# Altium footprint library Supernova.PcbLib: 77 footprints (part 3 of 6)
Each footprint in its own frame and in the unit in brackets; x right, y up, seen from the top. Pads: shape width x height; smd on the part's side, far side on the other; paste and mask are expansions set on the pad; w line width, h text height; cw(c..) or ccw(c..) is an arc to the next point about the centre after c.
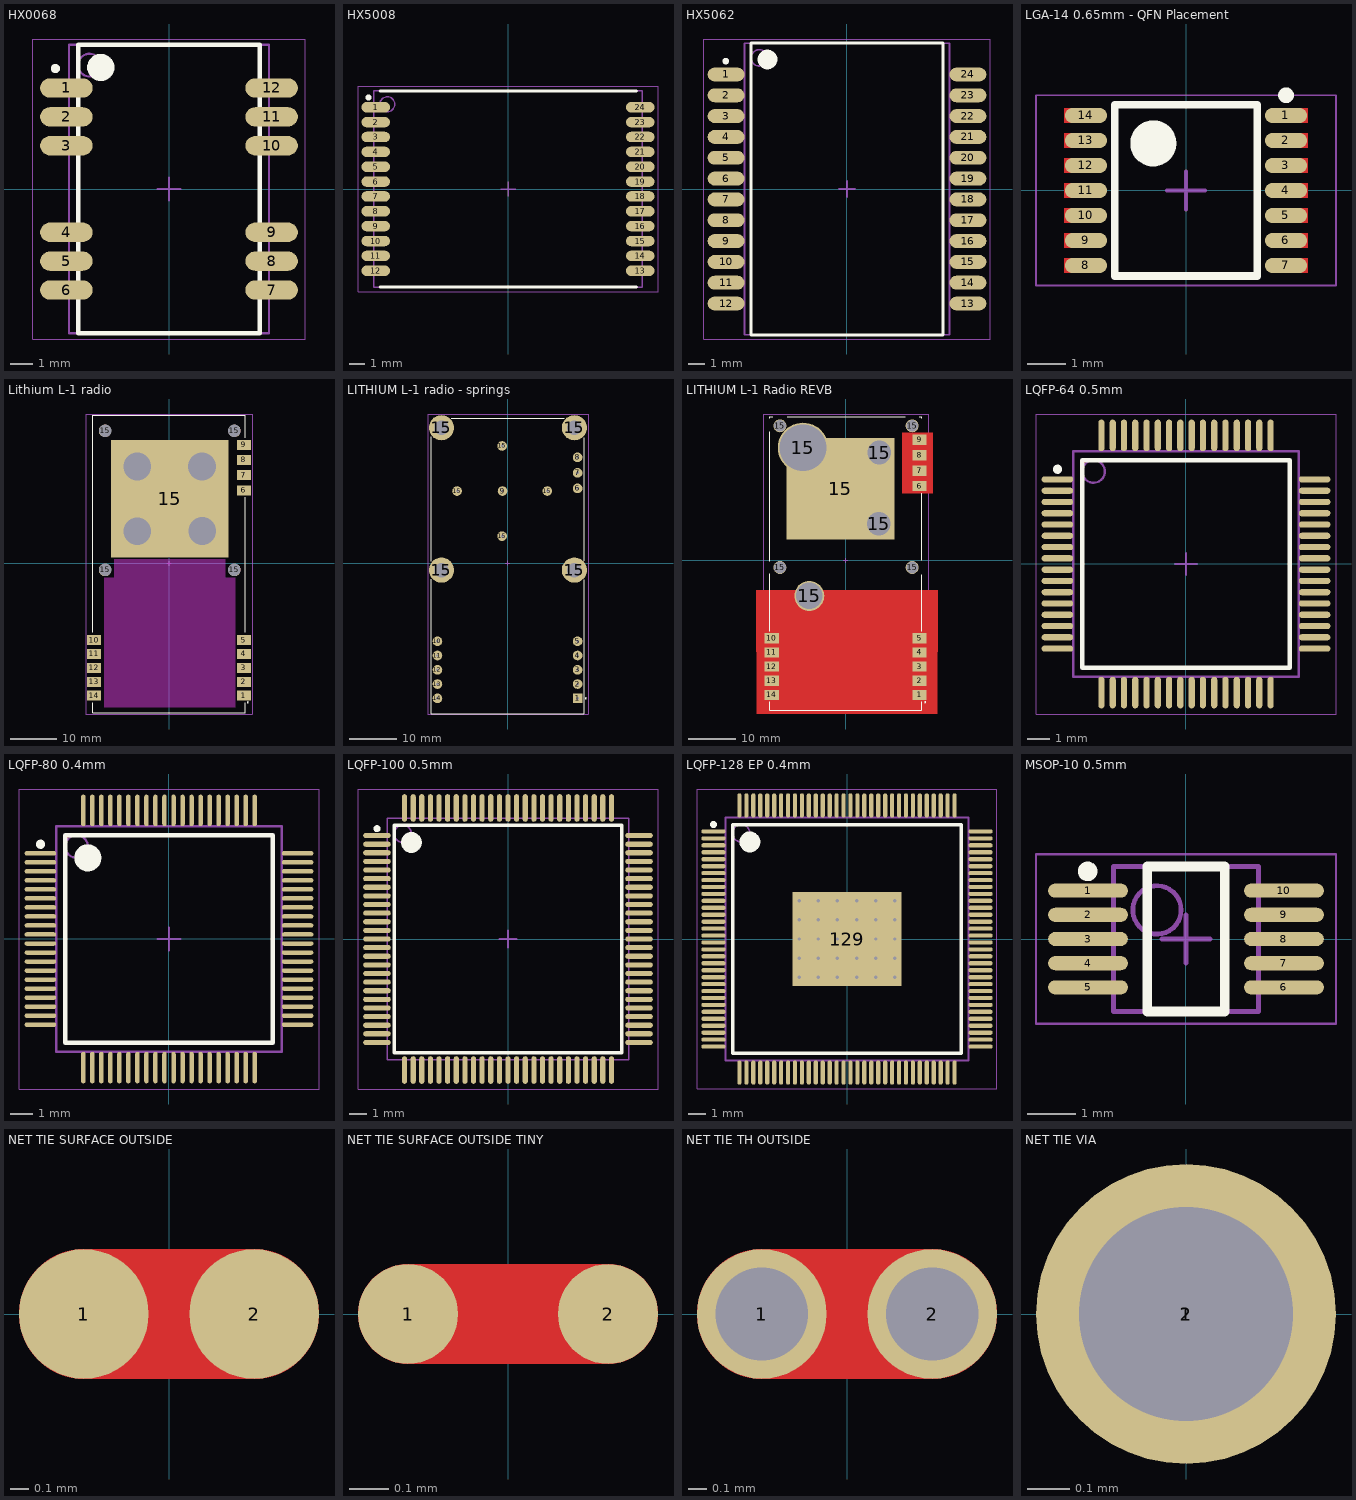
[diagram p2: the footprints below, top view; thin cyan lines are the x and y axes]

## HX0068 [mm] "SOIC, 16-Leads, Body 12.70x8.81mm, Pitch 1.27mm, IPC Medium Density"
height 2.09
pads (12):
  oval 2.314x0.85 smd: 1(-4.516,4.445) 2(-4.516,3.175) 3(-4.516,1.905) 4(-4.516,-1.905) 5(-4.516,-3.175) 6(-4.516,-4.445) 7(4.516,-4.445) 8(4.516,-3.175) 9(4.516,-1.905) 10(4.516,1.905) 11(4.516,3.175) 12(4.516,4.445)
Top Overlay:
  circle w0.6: c-3,5.35 r0.3
  circle w0.203: c-4.997,5.3 r0.102
  lines w0.2: -4,-6.35 -4,6.35 4,6.35 4,-6.35 -4,-6.35
Top 3D Body:
  circle w0.1: c-3.5,5.45 r0.5
  lines w0.1: -4.4,-6.35 -4.4,6.35 4.4,6.35 4.4,-6.35 -4.4,-6.35
Top Courtyard:
  lines w0.05: -6,-6.6 -6,6.6 6,6.6 6,-6.6 -6,-6.6
  lines w0.1: -0.5,0 0.5,0 ; 0,-0.5 0,0.5
3D body: height 0.2, standoff 0, extent -4.875,-4.725 4.875,-4.175
3D body: height 0.2, standoff 0, extent -4.875,-3.45 4.875,-2.9
3D body: height 0.2, standoff 0, extent -4.875,-2.175 4.875,-1.625
3D body: height 0.2, standoff 0, extent -4.875,4.175 4.875,4.725
3D body: height 0.2, standoff 0, extent -4.875,2.9 4.875,3.45
3D body: height 0.2, standoff 0, extent -4.875,1.625 4.875,2.175
3D body: height 2.09, standoff 0.05, extent -4.4,-6.35 4.4,6.35

## HX5008 [mil] "SOP, 24-Leads, Body 16.92x17.86mm, Pitch 0.99mm, IPC Medium Density"
height 241.34
pads (24):
  oval 75x27.56 smd mask+1.5: 1(-347,214.5) 2(-347,175.5) 3(-347,136.5) 4(-347,97.5) 5(-347,58.5) 6(-347,19.5) 7(-347,-19.5) 8(-347,-58.5) 9(-347,-97.5) 10(-347,-136.5) 11(-347,-175.5) 12(-347,-214.5) 13(347,-214.5) 14(347,-175.5) 15(347,-136.5) 16(347,-97.5) 17(347,-58.5) 18(347,-19.5) 19(347,19.5) 20(347,58.5) 21(347,97.5) 22(347,136.5) 23(347,175.5) 24(347,214.5)
Top Overlay:
  circle w8: c-366.02,240.18 r4
  lines w7.87: -336.61,-257.87 336.61,-257.87 ; -336.61,257.87 336.61,257.87
Top 3D Body:
  circle w3.94: c-316.93,222.44 r19.68
  lines w3.94: -352.36,-257.87 352.36,-257.87 352.36,257.87 -352.36,257.87 -352.36,-257.87
Top Courtyard:
  lines w1.97: -393.7,-269.69 393.7,-269.69 393.7,269.69 -393.7,269.69 -393.7,-269.69
  lines w3.94: -19.68,0 19.69,0 ; 0,-19.68 0,19.68
3D body: height 241.34, standoff 5.12, extent -352.36,-257.87 352.36,257.87
3D body: height 19.68, standoff 0, extent -369.09,203.74 369.09,225.4
3D body: height 19.68, standoff 0, extent -369.09,164.37 369.09,186.03
3D body: height 19.68, standoff 0, extent -369.09,125.98 369.09,147.64
3D body: height 19.68, standoff 0, extent -369.09,86.61 369.09,108.27
3D body: height 19.68, standoff 0, extent -369.09,47.24 369.09,68.9
3D body: height 19.68, standoff 0, extent -369.09,8.86 369.09,30.51
3D body: height 19.68, standoff 0, extent -369.09,-30.51 369.09,-8.86
3D body: height 19.68, standoff 0, extent -369.09,-69.88 369.09,-48.23
3D body: height 19.68, standoff 0, extent -369.09,-108.27 369.09,-86.61
3D body: height 19.68, standoff 0, extent -369.09,-147.64 369.09,-125.98
3D body: height 19.68, standoff 0, extent -369.09,-186.02 369.09,-164.37
3D body: height 19.68, standoff 0, extent -369.09,-225.39 369.09,-203.74

## HX5062 [mm] "SOIC, 24-Leads, Body 17.53x12.20mm, Pitch 1.27mm, IPC Medium Density"
height 5.51
pads (24):
  oval 2.25x0.85 smd: 1(-7.375,6.985) 2(-7.375,5.715) 3(-7.375,4.445) 4(-7.375,3.175) 5(-7.375,1.905) 6(-7.375,0.635) 7(-7.375,-0.635) 8(-7.375,-1.905) 9(-7.375,-3.175) 10(-7.375,-4.445) 11(-7.375,-5.715) 12(-7.375,-6.985) 13(7.375,-6.985) 14(7.375,-5.715) 15(7.375,-4.445) 16(7.375,-3.175) 17(7.375,-1.905) 18(7.375,-0.635) 19(7.375,0.635) 20(7.375,1.905) 21(7.375,3.175) 22(7.375,4.445) 23(7.375,5.715) 24(7.375,6.985)
Top Overlay:
  circle w0.6: c-4.85,7.9 r0.3
  circle w0.203: c-7.397,7.8 r0.102
  lines w0.2: -5.85,-8.9 -5.85,8.9 5.85,8.9 5.85,-8.9 -5.85,-8.9
Top 3D Body:
  circle w0.1: c-5.35,8 r0.5
  lines w0.1: -6.25,-8.9 -6.25,8.9 6.25,8.9 6.25,-8.9 -6.25,-8.9
Top Courtyard:
  lines w0.05: -8.725,-9.15 -8.725,9.15 8.725,9.15 8.725,-9.15 -8.725,-9.15
  lines w0.1: -0.5,0 0.5,0 ; 0,-0.5 0,0.5
3D body: height 0.5, standoff 0, extent -7.875,-7.25 7.875,-6.7
3D body: height 0.5, standoff 0, extent -7.875,-6 7.875,-5.45
3D body: height 0.5, standoff 0, extent -7.875,-4.725 7.875,-4.175
3D body: height 0.5, standoff 0, extent -7.875,-3.45 7.875,-2.9
3D body: height 0.5, standoff 0, extent -7.875,-2.175 7.875,-1.625
3D body: height 0.5, standoff 0, extent -7.875,-0.9 7.875,-0.35
3D body: height 0.5, standoff 0, extent -7.875,0.35 7.875,0.9
3D body: height 0.5, standoff 0, extent -7.875,1.625 7.875,2.175
3D body: height 0.5, standoff 0, extent -7.875,2.9 7.875,3.45
3D body: height 0.5, standoff 0, extent -7.875,4.175 7.875,4.725
3D body: height 0.5, standoff 0, extent -7.875,5.425 7.875,5.975
3D body: height 0.5, standoff 0, extent -7.875,6.7 7.875,7.25
3D body: height 5.51, standoff 0, extent -6.25,-8.9 6.25,8.9

## LGA-14 0.65mm - QFN Placement [mm]
height 1.1
pads (14):
  oval 1.1x0.4 smd mask+0.02: 1(2.6,1.95) 2(2.6,1.3) 3(2.6,0.65) 4(2.6,0) 5(2.6,-0.65) 6(2.6,-1.3) 7(2.6,-1.95) 8(-2.6,-1.95) 9(-2.6,-1.3) 10(-2.6,-0.65) 11(-2.6,0) 12(-2.6,0.65) 13(-2.6,1.3) 14(-2.6,1.95)
Top Layer:
  rectangle: -3.175,-0.2 -2.921,0.2
  rectangle: -3.175,0.45 -2.921,0.85
  rectangle: -3.175,1.1 -2.921,1.5
  rectangle: -3.175,1.75 -2.921,2.15
  rectangle: -3.175,-0.85 -2.921,-0.45
  rectangle: -3.175,-1.5 -2.921,-1.1
  rectangle: -3.175,-2.15 -2.921,-1.75
  region: 3.175,-1.75 2.921,-1.75 2.921,-2.15 3.175,-2.15
  region: 3.175,-1.1 2.921,-1.1 2.921,-1.5 3.175,-1.5
  region: 3.175,-0.45 2.921,-0.45 2.921,-0.85 3.175,-0.85
  region: 3.175,0.2 2.921,0.2 2.921,-0.2 3.175,-0.2
  region: 3.175,0.85 2.921,0.85 2.921,0.45 3.175,0.45
  region: 3.175,1.5 2.921,1.5 2.921,1.1 3.175,1.1
  region: 3.175,2.15 2.921,2.15 2.921,1.75 3.175,1.75
Top Overlay:
  circle w0.6: c-0.85,1.225 r0.3
  circle w0.203: c2.6,2.475 r0.102
  lines w0.2: -1.85,-2.225 -1.85,2.225 1.85,2.225 1.85,-2.225 -1.85,-2.225
Top Courtyard:
  lines w0.05: -3.9,-2.475 -3.9,2.475 3.9,2.475 3.9,-2.475 -3.9,-2.475
  lines w0.1: -0.5,0 0.5,0 ; 0,-0.5 0,0.5

## Lithium L-1 radio [mm]
height 11.2
pads (19):
  rect 3x2.15 smd paste-2: 1(16.15,-28.56) 2(16.15,-25.56) 3(16.15,-22.56) 4(16.15,-19.56) 5(16.15,-16.56) 6(16.15,15.75) 7(16.15,19.02) 8(16.15,22.29) 9(16.15,25.56) 10(-16.15,-16.58) 11(-16.15,-19.56) 12(-16.15,-22.56) 13(-16.15,-25.56) 14(-16.15,-28.56)
  round 2.7 / inner round 2.7 / far side round 4.5 hole 2.7: 15(-13.8,-1.44) 15(-13.8,28.56) 15(14.1,-1.44) 15(14.1,28.56)
  rect 25.35x25.35 smd paste-20: 15(0.15,13.91)
via 7.175,6.935 diameter 8 hole 6
via 7.15,20.91 diameter 8 hole 6
via -6.85,6.91 diameter 8 hole 6
via -6.85,20.91 diameter 8 hole 6
Top Layer keep-out:
  rectangle: -14.05,-31.09 14.35,-3.09
  rectangle: -11.85,-3.09 12.15,0.91
Top Overlay:
  circle w0.203: c17,-30 r0.102
  lines w0.254: -16.45,-30.09 -16.45,-32.19 16.45,-32.19 16.45,-30.09 ; -16.45,-14.89 -16.45,31.91 16.45,31.91 16.45,27.11 ; 16.45,-14.89 16.45,12.81 16.45,14.21
Top Courtyard:
  lines w0.05: -18,-32.5 18,-32.5 18,32.2 -18,32.2 -18,-32.5
  lines w0.1: -0.48,0 0.48,0 ; 0,-0.48 0,0.48
3D body "Lithium_Radio_Right_Angle.STEP": height 11.44, standoff 0, extent -15.85,-31.592 16.15,35.008

## LITHIUM L-1 radio - springs [mil]
pads (22):
  rect 80x80 hole 20: 1(581.3,-1122.05)
  round 80 hole 20: 2(581.3,-1003.7) 3(581.3,-885.31) 4(581.3,-766.97) 5(581.3,-648.62) 6(581.3,619.09) 7(581.3,748.03) 8(581.3,876.97) 9(-41.36,597.27) 10(-581.3,-648.62) 11(-581.3,-766.97) 12(-581.3,-885.31) 13(-581.3,-1003.7) 14(-581.3,-1122.05) 15(-418.52,597.27) 15(-44.51,223.25) 15(-44.51,971.28) 15(329.51,597.27)
  round 208.66 hole 118.11: 15(-548.03,-59.06) 15(-548.03,1122.05) 15(554.33,-59.06) 15(554.33,1122.05)
Top Overlay:
  circle w8: c649.61,-1122.05 r4
  lines w5: -633.66,-1181.1 -633.66,-133.86 ; -633.66,-1180.12 -633.66,-1250.09 630.91,-1250.09 ; -633.66,15.75 -633.66,560.04 -633.66,1047.24 ; -466.99,1200.64 472.44,1200.64 ; 634.84,-1250.09 634.84,-591.54 634.84,-137.72 ; 634.84,19.79 634.84,560.04 634.84,1039.37
Top Courtyard:
  lines w1.97: -661.42,-1251.97 -661.42,1236.22 669.29,1236.22 669.29,-1251.97 -661.42,-1251.97
  lines w3.94: -18.9,0 18.9,0 ; 0,-18.9 0,18.9
3D body "Lithium_Radio_Right_Angle.STEP": height 686.58, standoff 236.39, extent -628.74,-1246.13 631.1,1375.92
3D body "9774060943R.step": height 236.22, standoff -55.12, extent -633.65,1036.55 -462.39,1207.56
3D body "9774060943R.step": height 236.22, standoff -55.12, extent -633.65,-144.55 -462.39,26.46
3D body "9774060943R.step": height 236.22, standoff -55.12, extent 468.71,-144.55 639.97,26.46
3D body "9774060943R.step": height 236.22, standoff -55.12, extent 468.71,1036.55 639.97,1207.56
3D body "mill-max-0906-0-15-20-76-14-11-0.step": height 136, standoff -70, extent -617.29,-684.62 -545.29,-612.62
3D body "mill-max-0906-0-15-20-76-14-11-0.step": height 136, standoff -70, extent -617.29,-802.96 -545.29,-730.96
3D body "mill-max-0906-0-15-20-76-14-11-0.step": height 136, standoff -70, extent -617.29,-921.31 -545.29,-849.31
3D body "mill-max-0906-0-15-20-76-14-11-0.step": height 136, standoff -70, extent -617.29,-1039.7 -545.29,-967.7
3D body "mill-max-0906-0-15-20-76-14-11-0.step": height 136, standoff -70, extent -617.29,-1158.04 -545.29,-1086.04
3D body "mill-max-0906-0-15-20-76-14-11-0.step": height 136, standoff -70, extent 545.31,-1158.04 617.31,-1086.04
3D body "mill-max-0906-0-15-20-76-14-11-0.step": height 136, standoff -70, extent 545.31,-1039.7 617.31,-967.7
3D body "mill-max-0906-0-15-20-76-14-11-0.step": height 136, standoff -70, extent 545.31,-921.31 617.31,-849.31
3D body "mill-max-0906-0-15-20-76-14-11-0.step": height 136, standoff -70, extent 545.31,-802.96 617.31,-730.96
3D body "mill-max-0906-0-15-20-76-14-11-0.step": height 136, standoff -70, extent 545.31,-684.62 617.31,-612.62
3D body "mill-max-0906-0-15-20-76-14-11-0.step": height 136, standoff -70, extent 545.31,583.1 617.31,655.1
3D body "mill-max-0906-0-15-20-76-14-11-0.step": height 136, standoff -70, extent 545.31,712.04 617.31,784.04
3D body "mill-max-0906-0-15-20-76-14-11-0.step": height 136, standoff -70, extent 545.31,840.97 617.31,912.97
3D body "mill-max-0906-0-15-20-76-14-11-0.step": height 136, standoff -70, extent -77.35,561.27 -5.35,633.27
3D body "mill-max-0906-0-15-20-76-14-11-0.step": height 136, standoff -70, extent -454.52,561.27 -382.52,633.27
3D body "mill-max-0906-0-15-20-76-14-11-0.step": height 136, standoff -70, extent -80.5,935.29 -8.5,1007.29
3D body "mill-max-0906-0-15-20-76-14-11-0.step": height 136, standoff -70, extent -80.5,187.26 -8.5,259.26
3D body "mill-max-0906-0-15-20-76-14-11-0.step": height 136, standoff -70, extent 293.51,561.27 365.51,633.27

## LITHIUM L-1 Radio REVB [mm]
pads (23):
  rect 3x2.159 smd paste-2 mask+0.102: 1(15.665,-28.5) 2(15.665,-25.494) 3(15.665,-22.487) 4(15.665,-19.481) 5(15.665,-16.475) 6(15.665,15.725) 7(15.665,19) 8(15.665,22.275) 9(15.665,25.55) 10(-15.665,-16.475) 11(-15.665,-19.481) 12(-15.665,-22.487) 13(-15.665,-25.494) 14(-15.665,-28.5)
  round 2.75 / inner round 2.75 / far side round 4.5 hole 2.5: 15(-13.92,-1.5) 15(-13.92,28.5) 15(14.08,-1.5) 15(14.08,28.5)
  round 10.668 hole 9.906: 15(-9.043,23.852)
  round 6.35 hole 5.588: 15(-7.708,-7.514)
  rect 22.86x21.59 smd paste-20: 15(-1.13,15.171)
  round 6 hole 5: 15(6.969,7.722) 15(7.113,22.836)
Top Layer:
  pour cut-out: -18.895,-6.3 19.455,-6.3 19.443,-32.525 -18.882,-32.525
  pour cut-out: 11.93,27.037 18.48,27.037 18.48,14.213 11.93,14.213
Top Overlay:
  circle w0.203: c16.803,-30 r0.102
  lines w0.127: -16.095,-29.975 -16.095,-31.752 16.025,-31.752 ; -16.095,-15.025 -16.095,-2.8 ; -16.095,-0.2 -16.095,14.225 -16.095,27.2 ; -16.095,30.075 -16.095,30.47 -15.43,30.47 ; -12.37,30.47 12.57,30.47 ; 15.622,30.47 16.125,30.47 16.125,30.075 ; 16.125,-31.752 16.125,-29.975 ; 16.125,-15.025 16.125,-3.075 ; 16.125,0.075 16.125,14.225
Top Courtyard:
  lines w0.05: -17.5,-31.8 17.5,-31.8 17.5,31 -17.5,31 -17.5,-31.8
  lines w0.1: -0.48,0 0.48,0 ; 0,-0.48 0,0.48
3D body "Lithium_Radio_Right_Angle.STEP": height 11.44, standoff 0, extent -15.97,-31.652 16.03,34.948

## LQFP-64 0.5mm [mm] "TSQFP, 64-Leads, Body 10.00x10.00mm, Pitch 0.50mm, Thermal Pad 5.41x6.29mm, IPC Medium Density"
height 1.2
pads (64):
  oval 1.4x0.279 smd mask+0: 1(-5.7,3.75) 2(-5.7,3.25) 3(-5.7,2.75) 4(-5.7,2.25) 5(-5.7,1.75) 6(-5.7,1.25) 7(-5.7,0.75) 8(-5.7,0.25) 9(-5.7,-0.25) 10(-5.7,-0.75) 11(-5.7,-1.25) 12(-5.7,-1.75) 13(-5.7,-2.25) 14(-5.7,-2.75) 15(-5.7,-3.25) 16(-5.7,-3.75) 33(5.7,-3.75) 34(5.7,-3.25) 35(5.7,-2.75) 36(5.7,-2.25) 37(5.7,-1.75) 38(5.7,-1.25) 39(5.7,-0.75) 40(5.7,-0.25) 41(5.7,0.25) 42(5.7,0.75) 43(5.7,1.25) 44(5.7,1.75) 45(5.7,2.25) 46(5.7,2.75) 47(5.7,3.25) 48(5.7,3.75)
  oval 0.279x1.4 smd mask+0: 17(-3.75,-5.7) 18(-3.25,-5.7) 19(-2.75,-5.7) 20(-2.25,-5.7) 21(-1.75,-5.7) 22(-1.25,-5.7) 23(-0.75,-5.7) 24(-0.25,-5.7) 25(0.25,-5.7) 26(0.75,-5.7) 27(1.25,-5.7) 28(1.75,-5.7) 29(2.25,-5.7) 30(2.75,-5.7) 31(3.25,-5.7) 32(3.75,-5.7) 49(3.75,5.7) 50(3.25,5.7) 51(2.75,5.7) 52(2.25,5.7) 53(1.75,5.7) 54(1.25,5.7) 55(0.75,5.7) 56(0.25,5.7) 57(-0.25,5.7) 58(-0.75,5.7) 59(-1.25,5.7) 60(-1.75,5.7) 61(-2.25,5.7) 62(-2.75,5.7) 63(-3.25,5.7) 64(-3.75,5.7)
Top Overlay:
  circle w0.203: c-5.697,4.2 r0.102
  lines w0.2: -4.6,-4.6 -4.6,4.6 4.6,4.6 4.6,-4.6 -4.6,-4.6
Top 3D Body:
  circle w0.1: c-4.1,4.1 r0.5
  lines w0.1: -5,-5 -5,5 5,5 5,-5 -5,-5
Top Courtyard:
  lines w0.05: -6.65,-6.65 -6.65,6.65 6.65,6.65 6.65,-6.65 -6.65,-6.65
  lines w0.1: -0.48,0 0.48,0 ; 0,-0.48 0,0.48
3D body "User Library-LQFP64-1.step": height 1.56, standoff 0, extent -6,-6 6,6

## LQFP-80 0.4mm [mm] "TSQFP, 80-Leads, Body 10.00x10.00mm, Pitch 0.40mm, IPC Medium Density"
height 1.6
pads (80):
  oval 1.4x0.2 smd mask+0.013: 1(-5.7,3.8) 2(-5.7,3.4) 3(-5.7,3) 4(-5.7,2.6) 5(-5.7,2.2) 6(-5.7,1.8) 7(-5.7,1.4) 8(-5.7,1) 9(-5.7,0.6) 10(-5.7,0.2) 11(-5.7,-0.2) 12(-5.7,-0.6) 13(-5.7,-1) 14(-5.7,-1.4) 15(-5.7,-1.8) 16(-5.7,-2.2) 17(-5.7,-2.6) 18(-5.7,-3) 19(-5.7,-3.4) 20(-5.7,-3.8) 41(5.7,-3.8) 42(5.7,-3.4) 43(5.7,-3) 44(5.7,-2.6) 45(5.7,-2.2) 46(5.7,-1.8) 47(5.7,-1.4) 48(5.7,-1) 49(5.7,-0.6) 50(5.7,-0.2) 51(5.7,0.2) 52(5.7,0.6) 53(5.7,1) 54(5.7,1.4) 55(5.7,1.8) 56(5.7,2.2) 57(5.7,2.6) 58(5.7,3) 59(5.7,3.4) 60(5.7,3.8)
  oval 0.2x1.4 smd mask+0.013: 21(-3.8,-5.7) 22(-3.4,-5.7) 23(-3,-5.7) 24(-2.6,-5.7) 25(-2.2,-5.7) 26(-1.8,-5.7) 27(-1.4,-5.7) 28(-1,-5.7) 29(-0.6,-5.7) 30(-0.2,-5.7) 31(0.2,-5.7) 32(0.6,-5.7) 33(1,-5.7) 34(1.4,-5.7) 35(1.8,-5.7) 36(2.2,-5.7) 37(2.6,-5.7) 38(3,-5.7) 39(3.4,-5.7) 40(3.8,-5.7) 61(3.8,5.7) 62(3.4,5.7) 63(3,5.7) 64(2.6,5.7) 65(2.2,5.7) 66(1.8,5.7) 67(1.4,5.7) 68(1,5.7) 69(0.6,5.7) 70(0.2,5.7) 71(-0.2,5.7) 72(-0.6,5.7) 73(-1,5.7) 74(-1.4,5.7) 75(-1.8,5.7) 76(-2.2,5.7) 77(-2.6,5.7) 78(-3,5.7) 79(-3.4,5.7) 80(-3.8,5.7)
Top Overlay:
  circle w0.6: c-3.6,3.6 r0.3
  circle w0.203: c-5.697,4.2 r0.102
  lines w0.2: -4.6,-4.6 4.6,-4.6 4.6,4.6 -4.6,4.6 -4.6,-4.6
Top 3D Body:
  circle w0.1: c-4.1,4.1 r0.5
  lines w0.1: -5,-5 5,-5 5,5 -5,5 -5,-5
Top Courtyard:
  lines w0.05: -6.65,-6.65 6.65,-6.65 6.65,6.65 -6.65,6.65 -6.65,-6.65
  lines w0.1: -0.5,0 0.5,0 ; 0,-0.5 0,0.5
3D body: height 0.2, standoff 0, extent 3.725,4.675 3.875,6
3D body: height 0.2, standoff 0, extent 3.325,4.675 3.475,6
3D body: height 0.2, standoff 0, extent 2.925,4.675 3.075,6
3D body: height 0.2, standoff 0, extent 2.525,4.675 2.675,6
3D body: height 0.2, standoff 0, extent 2.125,4.675 2.275,6
3D body: height 0.2, standoff 0, extent 1.725,4.675 1.875,6
3D body: height 0.2, standoff 0, extent 1.325,4.675 1.475,6
3D body: height 0.2, standoff 0, extent 0.925,4.675 1.075,6
3D body: height 0.2, standoff 0, extent 0.525,4.675 0.675,6
3D body: height 0.2, standoff 0, extent 0.125,4.675 0.275,6
3D body: height 0.2, standoff 0, extent -0.275,4.675 -0.125,6
3D body: height 0.2, standoff 0, extent -0.675,4.675 -0.525,6
3D body: height 0.2, standoff 0, extent -1.075,4.675 -0.925,6
3D body: height 0.2, standoff 0, extent -1.475,4.675 -1.325,6
3D body: height 0.2, standoff 0, extent -1.875,4.675 -1.725,6
3D body: height 0.2, standoff 0, extent -2.275,4.675 -2.125,6
3D body: height 0.2, standoff 0, extent -2.675,4.675 -2.525,6
3D body: height 0.2, standoff 0, extent -3.075,4.675 -2.925,6
3D body: height 0.2, standoff 0, extent -3.475,4.675 -3.325,6
3D body: height 0.2, standoff 0, extent -3.875,4.675 -3.725,6
3D body: height 0.2, standoff 0, extent 4.675,-3.875 6,-3.725
3D body: height 0.2, standoff 0, extent 4.675,-3.475 6,-3.325
3D body: height 0.2, standoff 0, extent 4.675,-3.075 6,-2.925
3D body: height 0.2, standoff 0, extent 4.675,-2.675 6,-2.525
3D body: height 0.2, standoff 0, extent 4.675,-2.275 6,-2.125
3D body: height 0.2, standoff 0, extent 4.675,-1.875 6,-1.725
3D body: height 0.2, standoff 0, extent 4.675,-1.475 6,-1.325
3D body: height 0.2, standoff 0, extent 4.675,-1.075 6,-0.925
3D body: height 0.2, standoff 0, extent 4.675,-0.675 6,-0.525
3D body: height 0.2, standoff 0, extent 4.675,-0.275 6,-0.125
3D body: height 0.2, standoff 0, extent 4.675,0.125 6,0.275
3D body: height 0.2, standoff 0, extent 4.675,0.525 6,0.675
3D body: height 0.2, standoff 0, extent 4.675,0.925 6,1.075
3D body: height 0.2, standoff 0, extent 4.675,1.325 6,1.475
3D body: height 0.2, standoff 0, extent 4.675,1.725 6,1.875
3D body: height 0.2, standoff 0, extent 4.675,2.125 6,2.275
3D body: height 0.2, standoff 0, extent 4.675,2.525 6,2.675
3D body: height 0.2, standoff 0, extent 4.675,2.925 6,3.075
3D body: height 0.2, standoff 0, extent 4.675,3.325 6,3.475
3D body: height 0.2, standoff 0, extent 4.675,3.725 6,3.875
3D body: height 0.2, standoff 0, extent -3.875,-6 -3.725,-4.675
3D body: height 0.2, standoff 0, extent -3.475,-6 -3.325,-4.675
3D body: height 0.2, standoff 0, extent -3.075,-6 -2.925,-4.675
3D body: height 0.2, standoff 0, extent -2.675,-6 -2.525,-4.675
3D body: height 0.2, standoff 0, extent -2.275,-6 -2.125,-4.675
3D body: height 0.2, standoff 0, extent -1.875,-6 -1.725,-4.675
3D body: height 0.2, standoff 0, extent -1.475,-6 -1.325,-4.675
3D body: height 0.2, standoff 0, extent -1.075,-6 -0.925,-4.675
3D body: height 0.2, standoff 0, extent -0.675,-6 -0.525,-4.675
3D body: height 0.2, standoff 0, extent -0.275,-6 -0.125,-4.675
3D body: height 0.2, standoff 0, extent 0.125,-6 0.275,-4.675
3D body: height 0.2, standoff 0, extent 0.525,-6 0.675,-4.675
3D body: height 0.2, standoff 0, extent 0.925,-6 1.075,-4.675
3D body: height 0.2, standoff 0, extent 1.325,-6 1.475,-4.675
3D body: height 0.2, standoff 0, extent 1.725,-6 1.875,-4.675
3D body: height 0.2, standoff 0, extent 2.125,-6 2.275,-4.675
3D body: height 0.2, standoff 0, extent 2.525,-6 2.675,-4.675
3D body: height 0.2, standoff 0, extent 2.925,-6 3.075,-4.675
3D body: height 0.2, standoff 0, extent 3.325,-6 3.475,-4.675
3D body: height 0.2, standoff 0, extent 3.725,-6 3.875,-4.675
3D body: height 0.2, standoff 0, extent -6,-3.875 -4.675,-3.725
3D body: height 0.2, standoff 0, extent -6,-3.475 -4.675,-3.325
3D body: height 0.2, standoff 0, extent -6,-3.075 -4.675,-2.925
3D body: height 0.2, standoff 0, extent -6,-2.675 -4.675,-2.525
3D body: height 0.2, standoff 0, extent -6,-2.275 -4.675,-2.125
3D body: height 0.2, standoff 0, extent -6,-1.875 -4.675,-1.725
3D body: height 0.2, standoff 0, extent -6,-1.475 -4.675,-1.325
3D body: height 0.2, standoff 0, extent -6,-1.075 -4.675,-0.925
3D body: height 0.2, standoff 0, extent -6,-0.675 -4.675,-0.525
3D body: height 0.2, standoff 0, extent -6,-0.275 -4.675,-0.125
3D body: height 0.2, standoff 0, extent -6,0.125 -4.675,0.275
3D body: height 0.2, standoff 0, extent -6,0.525 -4.675,0.675
3D body: height 0.2, standoff 0, extent -6,0.925 -4.675,1.075
3D body: height 0.2, standoff 0, extent -6,1.325 -4.675,1.475
3D body: height 0.2, standoff 0, extent -6,1.725 -4.675,1.875
3D body: height 0.2, standoff 0, extent -6,2.125 -4.675,2.275
3D body: height 0.2, standoff 0, extent -6,2.525 -4.675,2.675
3D body: height 0.2, standoff 0, extent -6,2.925 -4.675,3.075
3D body: height 0.2, standoff 0, extent -6,3.325 -4.675,3.475
3D body: height 1.6, standoff 0.05, extent -5,-4.975 5,5.025
3D body: height 0.2, standoff 0, extent -6,3.725 -4.675,3.875

## LQFP-100 0.5mm [mm] "TSQFP, 100-Leads, Body 14.00x14.00mm, Pitch 0.50mm, IPC Medium Density"
height 1.45
pads (100):
  oval 1.6x0.3 smd paste-0.025 mask+0.025: 1(-7.6,6) 2(-7.6,5.5) 3(-7.6,5) 4(-7.6,4.5) 5(-7.6,4) 6(-7.6,3.5) 7(-7.6,3) 8(-7.6,2.5) 9(-7.6,2) 10(-7.6,1.5) 11(-7.6,1) 12(-7.6,0.5) 13(-7.6,0) 14(-7.6,-0.5) 15(-7.6,-1) 16(-7.6,-1.5) 17(-7.6,-2) 18(-7.6,-2.5) 19(-7.6,-3) 20(-7.6,-3.5) 21(-7.6,-4) 22(-7.6,-4.5) 23(-7.6,-5) 24(-7.6,-5.5) 25(-7.6,-6) 51(7.6,-6) 52(7.6,-5.5) 53(7.6,-5) 54(7.6,-4.5) 55(7.6,-4) 56(7.6,-3.5) 57(7.6,-3) 58(7.6,-2.5) 59(7.6,-2) 60(7.6,-1.5) 61(7.6,-1) 62(7.6,-0.5) 63(7.6,0) 64(7.6,0.5) 65(7.6,1) 66(7.6,1.5) 67(7.6,2) 68(7.6,2.5) 69(7.6,3) 70(7.6,3.5) 71(7.6,4) 72(7.6,4.5) 73(7.6,5) 74(7.6,5.5) 75(7.6,6)
  oval 0.3x1.6 smd paste-0.025 mask+0.025: 26(-6,-7.6) 27(-5.5,-7.6) 28(-5,-7.6) 29(-4.5,-7.6) 30(-4,-7.6) 31(-3.5,-7.6) 32(-3,-7.6) 33(-2.5,-7.6) 34(-2,-7.6) 35(-1.5,-7.6) 36(-1,-7.6) 37(-0.5,-7.6) 38(0,-7.6) 39(0.5,-7.6) 40(1,-7.6) 41(1.5,-7.6) 42(2,-7.6) 43(2.5,-7.6) 44(3,-7.6) 45(3.5,-7.6) 46(4,-7.6) 47(4.5,-7.6) 48(5,-7.6) 49(5.5,-7.6) 50(6,-7.6) 76(6,7.6) 77(5.5,7.6) 78(5,7.6) 79(4.5,7.6) 80(4,7.6) 81(3.5,7.6) 82(3,7.6) 83(2.5,7.6) 84(2,7.6) 85(1.5,7.6) 86(1,7.6) 87(0.5,7.6) 88(0,7.6) 89(-0.5,7.6) 90(-1,7.6) 91(-1.5,7.6) 92(-2,7.6) 93(-2.5,7.6) 94(-3,7.6) 95(-3.5,7.6) 96(-4,7.6) 97(-4.5,7.6) 98(-5,7.6) 99(-5.5,7.6) 100(-6,7.6)
Top Overlay:
  circle w0.203: c-7.597,6.4 r0.102
  circle w0.6: c-5.6,5.6 r0.3
  lines w0.2: -6.6,-6.6 -6.6,6.6 6.6,6.6 6.6,-6.6 -6.6,-6.6
Top 3D Body:
  circle w0.1: c-6.1,6.1 r0.5
  lines w0.1: -7,-7 -7,7 7,7 7,-7 -7,-7
Top Courtyard:
  lines w0.05: -8.7,-8.7 -8.7,8.7 8.7,8.7 8.7,-8.7 -8.7,-8.7
  lines w0.1: -0.5,0 0.5,0 ; 0,-0.5 0,0.5
3D body: height 1.45, standoff 0.05, extent -7,-7 7,7

## LQFP-128 EP 0.4mm [mm] "TSQFP, 128-Leads, Body 14.00x14.00mm, Pitch 0.40mm, Thermal Pad 5.41x6.29mm, IPC Medium Density"
height 1.2
pads (129):
  oval 1.4x0.246 smd mask+0: 1(-7.7,6.2) 2(-7.7,5.8) 3(-7.7,5.4) 4(-7.7,5) 5(-7.7,4.6) 6(-7.7,4.2) 7(-7.7,3.8) 8(-7.7,3.4) 9(-7.7,3) 10(-7.7,2.6) 11(-7.7,2.2) 12(-7.7,1.8) 13(-7.7,1.4) 14(-7.7,1) 15(-7.7,0.6) 16(-7.7,0.2) 17(-7.7,-0.2) 18(-7.7,-0.6) 19(-7.7,-1) 20(-7.7,-1.4) 21(-7.7,-1.8) 22(-7.7,-2.2) 23(-7.7,-2.6) 24(-7.7,-3) 25(-7.7,-3.4) 26(-7.7,-3.8) 27(-7.7,-4.2) 28(-7.7,-4.6) 29(-7.7,-5) 30(-7.7,-5.4) 31(-7.7,-5.8) 32(-7.7,-6.2) 65(7.7,-6.2) 66(7.7,-5.8) 67(7.7,-5.4) 68(7.7,-5) 69(7.7,-4.6) 70(7.7,-4.2) 71(7.7,-3.8) 72(7.7,-3.4) 73(7.7,-3) 74(7.7,-2.6) 75(7.7,-2.2) 76(7.7,-1.8) 77(7.7,-1.4) 78(7.7,-1) 79(7.7,-0.6) 80(7.7,-0.2) 81(7.7,0.2) 82(7.7,0.6) 83(7.7,1) 84(7.7,1.4) 85(7.7,1.8) 86(7.7,2.2) 87(7.7,2.6) 88(7.7,3) 89(7.7,3.4) 90(7.7,3.8) 91(7.7,4.2) 92(7.7,4.6) 93(7.7,5) 94(7.7,5.4) 95(7.7,5.8) 96(7.7,6.2)
  oval 0.246x1.4 smd mask+0: 33(-6.2,-7.7) 34(-5.8,-7.7) 35(-5.4,-7.7) 36(-5,-7.7) 37(-4.6,-7.7) 38(-4.2,-7.7) 39(-3.8,-7.7) 40(-3.4,-7.7) 41(-3,-7.7) 42(-2.6,-7.7) 43(-2.2,-7.7) 44(-1.8,-7.7) 45(-1.4,-7.7) 46(-1,-7.7) 47(-0.6,-7.7) 48(-0.2,-7.7) 49(0.2,-7.7) 50(0.6,-7.7) 51(1,-7.7) 52(1.4,-7.7) 53(1.8,-7.7) 54(2.2,-7.7) 55(2.6,-7.7) 56(3,-7.7) 57(3.4,-7.7) 58(3.8,-7.7) 59(4.2,-7.7) 60(4.6,-7.7) 61(5,-7.7) 62(5.4,-7.7) 63(5.8,-7.7) 64(6.2,-7.7) 97(6.2,7.7) 98(5.8,7.7) 99(5.4,7.7) 100(5,7.7) 101(4.6,7.7) 102(4.2,7.7) 103(3.8,7.7) 104(3.4,7.7) 105(3,7.7) 106(2.6,7.7) 107(2.2,7.7) 108(1.8,7.7) 109(1.4,7.7) 110(1,7.7) 111(0.6,7.7) 112(0.2,7.7) 113(-0.2,7.7) 114(-0.6,7.7) 115(-1,7.7) 116(-1.4,7.7) 117(-1.8,7.7) 118(-2.2,7.7) 119(-2.6,7.7) 120(-3,7.7) 121(-3.4,7.7) 122(-3.8,7.7) 123(-4.2,7.7) 124(-4.6,7.7) 125(-5,7.7) 126(-5.4,7.7) 127(-5.8,7.7) 128(-6.2,7.7)
  rect 6.29x5.41 smd paste-6: 129(0,0)
via 2.75,2.2 diameter 0.5 hole 0.2
via 2.75,1.1 diameter 0.5 hole 0.2
via 2.75,0 diameter 0.5 hole 0.2
via 2.75,-1.1 diameter 0.5 hole 0.2
via 2.75,-2.2 diameter 0.5 hole 0.2
via 1.65,2.2 diameter 0.5 hole 0.2
via 1.65,1.1 diameter 0.5 hole 0.2
via 1.65,0 diameter 0.5 hole 0.2
via 1.65,-1.1 diameter 0.5 hole 0.2
via 1.65,-2.2 diameter 0.5 hole 0.2
via 0.55,2.2 diameter 0.5 hole 0.2
via 0.55,1.1 diameter 0.5 hole 0.2
via 0.55,0 diameter 0.5 hole 0.2
via 0.55,-1.1 diameter 0.5 hole 0.2
via 0.55,-2.2 diameter 0.5 hole 0.2
via -0.55,2.2 diameter 0.5 hole 0.2
via -0.55,1.1 diameter 0.5 hole 0.2
via -0.55,0 diameter 0.5 hole 0.2
via -0.55,-1.1 diameter 0.5 hole 0.2
via -0.55,-2.2 diameter 0.5 hole 0.2
via -1.65,2.2 diameter 0.5 hole 0.2
via -1.65,1.1 diameter 0.5 hole 0.2
via -1.65,0 diameter 0.5 hole 0.2
via -1.65,-1.1 diameter 0.5 hole 0.2
via -1.65,-2.2 diameter 0.5 hole 0.2
via -2.75,2.2 diameter 0.5 hole 0.2
via -2.75,1.1 diameter 0.5 hole 0.2
via -2.75,0 diameter 0.5 hole 0.2
via -2.75,-1.1 diameter 0.5 hole 0.2
via -2.75,-2.2 diameter 0.5 hole 0.2
Top Overlay:
  circle w0.6: c-5.6,5.6 r0.3
  circle w0.203: c-7.697,6.6 r0.102
  lines w0.2: -6.6,-6.6 -6.6,6.6 6.6,6.6 6.6,-6.6 -6.6,-6.6
Top Paste:
  rectangle: 0.2,0.3 3,2.4
  region: -0.2,2.4 -3,2.4 -3,0.3 -0.2,0.3
  region: -0.2,-0.3 -3,-0.3 -3,-2.4 -0.2,-2.4
  rectangle: 0.2,-2.4 3,-0.3
Top 3D Body:
  circle w0.1: c-6.1,6.1 r0.5
  lines w0.1: -7,-7 -7,7 7,7 7,-7 -7,-7
Top Courtyard:
  lines w0.05: -8.65,-8.65 -8.65,8.65 8.65,8.65 8.65,-8.65 -8.65,-8.65
  lines w0.1: -0.5,0 0.5,0 ; 0,-0.5 0,0.5
3D body: height 1.2, standoff 0.05, extent -7,-7 7,7
3D body: height 0.2, standoff 0, extent -8.075,6.1 -6.675,6.3
3D body: height 0.2, standoff 0, extent -8.075,5.7 -6.675,5.9
3D body: height 0.2, standoff 0, extent -8.075,5.3 -6.675,5.5
3D body: height 0.2, standoff 0, extent -8.075,4.9 -6.675,5.1
3D body: height 0.2, standoff 0, extent -8.075,3.3 -6.675,3.5
3D body: height 0.2, standoff 0, extent -8.075,3.7 -6.675,3.9
3D body: height 0.2, standoff 0, extent -8.075,4.1 -6.675,4.3
3D body: height 0.2, standoff 0, extent -8.075,4.5 -6.675,4.7
3D body: height 0.2, standoff 0, extent -8.075,1.7 -6.675,1.9
3D body: height 0.2, standoff 0, extent -8.075,2.1 -6.675,2.3
3D body: height 0.2, standoff 0, extent -8.075,2.5 -6.675,2.7
3D body: height 0.2, standoff 0, extent -8.075,2.9 -6.675,3.1
3D body: height 0.2, standoff 0, extent -8.075,0.1 -6.675,0.3
3D body: height 0.2, standoff 0, extent -8.075,0.5 -6.675,0.7
3D body: height 0.2, standoff 0, extent -8.075,0.9 -6.675,1.1
3D body: height 0.2, standoff 0, extent -8.075,1.3 -6.675,1.5
3D body: height 0.2, standoff 0, extent -8.075,-1.5 -6.675,-1.3
3D body: height 0.2, standoff 0, extent -8.075,-1.1 -6.675,-0.9
3D body: height 0.2, standoff 0, extent -8.075,-0.7 -6.675,-0.5
3D body: height 0.2, standoff 0, extent -8.075,-0.3 -6.675,-0.1
3D body: height 0.2, standoff 0, extent -8.075,-3.1 -6.675,-2.9
3D body: height 0.2, standoff 0, extent -8.075,-2.7 -6.675,-2.5
3D body: height 0.2, standoff 0, extent -8.075,-2.3 -6.675,-2.1
3D body: height 0.2, standoff 0, extent -8.075,-1.9 -6.675,-1.7
3D body: height 0.2, standoff 0, extent -8.075,-4.7 -6.675,-4.5
3D body: height 0.2, standoff 0, extent -8.075,-4.3 -6.675,-4.1
3D body: height 0.2, standoff 0, extent -8.075,-3.9 -6.675,-3.7
3D body: height 0.2, standoff 0, extent -8.075,-3.5 -6.675,-3.3
3D body: height 0.2, standoff 0, extent -8.075,-6.3 -6.675,-6.1
3D body: height 0.2, standoff 0, extent -8.075,-5.9 -6.675,-5.7
3D body: height 0.2, standoff 0, extent -8.075,-5.5 -6.675,-5.3
3D body: height 0.2, standoff 0, extent -8.075,-5.1 -6.675,-4.9
3D body: height 0.2, standoff 0, extent 4.9,-8.075 5.1,-6.675
3D body: height 0.2, standoff 0, extent 5.3,-8.075 5.5,-6.675
3D body: height 0.2, standoff 0, extent 5.7,-8.075 5.9,-6.675
3D body: height 0.2, standoff 0, extent 6.1,-8.075 6.3,-6.675
3D body: height 0.2, standoff 0, extent 3.3,-8.075 3.5,-6.675
3D body: height 0.2, standoff 0, extent 3.7,-8.075 3.9,-6.675
3D body: height 0.2, standoff 0, extent 4.1,-8.075 4.3,-6.675
3D body: height 0.2, standoff 0, extent 4.5,-8.075 4.7,-6.675
3D body: height 0.2, standoff 0, extent 1.7,-8.075 1.9,-6.675
3D body: height 0.2, standoff 0, extent 2.1,-8.075 2.3,-6.675
3D body: height 0.2, standoff 0, extent 2.5,-8.075 2.7,-6.675
3D body: height 0.2, standoff 0, extent 2.9,-8.075 3.1,-6.675
3D body: height 0.2, standoff 0, extent 0.1,-8.075 0.3,-6.675
3D body: height 0.2, standoff 0, extent 0.5,-8.075 0.7,-6.675
3D body: height 0.2, standoff 0, extent 0.9,-8.075 1.1,-6.675
3D body: height 0.2, standoff 0, extent 1.3,-8.075 1.5,-6.675
3D body: height 0.2, standoff 0, extent -1.5,-8.075 -1.3,-6.675
3D body: height 0.2, standoff 0, extent -1.1,-8.075 -0.9,-6.675
3D body: height 0.2, standoff 0, extent -0.7,-8.075 -0.5,-6.675
3D body: height 0.2, standoff 0, extent -0.3,-8.075 -0.1,-6.675
3D body: height 0.2, standoff 0, extent -3.1,-8.075 -2.9,-6.675
3D body: height 0.2, standoff 0, extent -2.7,-8.075 -2.5,-6.675
3D body: height 0.2, standoff 0, extent -2.3,-8.075 -2.1,-6.675
3D body: height 0.2, standoff 0, extent -1.9,-8.075 -1.7,-6.675
3D body: height 0.2, standoff 0, extent -4.7,-8.075 -4.5,-6.675
3D body: height 0.2, standoff 0, extent -4.3,-8.075 -4.1,-6.675
3D body: height 0.2, standoff 0, extent -3.9,-8.075 -3.7,-6.675
3D body: height 0.2, standoff 0, extent -3.5,-8.075 -3.3,-6.675
3D body: height 0.2, standoff 0, extent -5.1,-8.075 -4.9,-6.675
3D body: height 0.2, standoff 0, extent -5.5,-8.075 -5.3,-6.675
3D body: height 0.2, standoff 0, extent -5.9,-8.075 -5.7,-6.675
3D body: height 0.2, standoff 0, extent -6.3,-8.075 -6.1,-6.675
3D body: height 0.2, standoff 0, extent 6.675,4.9 8.075,5.1
3D body: height 0.2, standoff 0, extent 6.675,5.3 8.075,5.5
3D body: height 0.2, standoff 0, extent 6.675,5.7 8.075,5.9
3D body: height 0.2, standoff 0, extent 6.675,6.1 8.075,6.3
3D body: height 0.2, standoff 0, extent 6.675,3.3 8.075,3.5
3D body: height 0.2, standoff 0, extent 6.675,3.7 8.075,3.9
3D body: height 0.2, standoff 0, extent 6.675,4.1 8.075,4.3
3D body: height 0.2, standoff 0, extent 6.675,4.5 8.075,4.7
3D body: height 0.2, standoff 0, extent 6.675,1.7 8.075,1.9
3D body: height 0.2, standoff 0, extent 6.675,2.1 8.075,2.3
3D body: height 0.2, standoff 0, extent 6.675,2.5 8.075,2.7
3D body: height 0.2, standoff 0, extent 6.675,2.9 8.075,3.1
3D body: height 0.2, standoff 0, extent 6.675,0.1 8.075,0.3
3D body: height 0.2, standoff 0, extent 6.675,0.5 8.075,0.7
3D body: height 0.2, standoff 0, extent 6.675,0.9 8.075,1.1
3D body: height 0.2, standoff 0, extent 6.675,1.3 8.075,1.5
3D body: height 0.2, standoff 0, extent 6.675,-1.5 8.075,-1.3
3D body: height 0.2, standoff 0, extent 6.675,-1.1 8.075,-0.9
3D body: height 0.2, standoff 0, extent 6.675,-0.7 8.075,-0.5
3D body: height 0.2, standoff 0, extent 6.675,-0.3 8.075,-0.1
3D body: height 0.2, standoff 0, extent 6.675,-3.1 8.075,-2.9
3D body: height 0.2, standoff 0, extent 6.675,-2.7 8.075,-2.5
3D body: height 0.2, standoff 0, extent 6.675,-2.3 8.075,-2.1
3D body: height 0.2, standoff 0, extent 6.675,-1.9 8.075,-1.7
3D body: height 0.2, standoff 0, extent 6.675,-4.7 8.075,-4.5
3D body: height 0.2, standoff 0, extent 6.675,-4.3 8.075,-4.1
3D body: height 0.2, standoff 0, extent 6.675,-3.9 8.075,-3.7
3D body: height 0.2, standoff 0, extent 6.675,-3.5 8.075,-3.3
3D body: height 0.2, standoff 0, extent 6.675,-5.1 8.075,-4.9
3D body: height 0.2, standoff 0, extent 6.675,-5.5 8.075,-5.3
3D body: height 0.2, standoff 0, extent 6.675,-5.9 8.075,-5.7
3D body: height 0.2, standoff 0, extent 6.675,-6.3 8.075,-6.1
3D body: height 0.2, standoff 0, extent -5.1,6.675 -4.9,8.075
3D body: height 0.2, standoff 0, extent -5.5,6.675 -5.3,8.075
3D body: height 0.2, standoff 0, extent -5.9,6.675 -5.7,8.075
3D body: height 0.2, standoff 0, extent -6.3,6.675 -6.1,8.075
3D body: height 0.2, standoff 0, extent -3.5,6.675 -3.3,8.075
3D body: height 0.2, standoff 0, extent -3.9,6.675 -3.7,8.075
3D body: height 0.2, standoff 0, extent -4.3,6.675 -4.1,8.075
3D body: height 0.2, standoff 0, extent -4.7,6.675 -4.5,8.075
3D body: height 0.2, standoff 0, extent -1.9,6.675 -1.7,8.075
3D body: height 0.2, standoff 0, extent -2.3,6.675 -2.1,8.075
3D body: height 0.2, standoff 0, extent -2.7,6.675 -2.5,8.075
3D body: height 0.2, standoff 0, extent -3.1,6.675 -2.9,8.075
3D body: height 0.2, standoff 0, extent -0.3,6.675 -0.1,8.075
3D body: height 0.2, standoff 0, extent -0.7,6.675 -0.5,8.075
3D body: height 0.2, standoff 0, extent -1.1,6.675 -0.9,8.075
3D body: height 0.2, standoff 0, extent -1.5,6.675 -1.3,8.075
3D body: height 0.2, standoff 0, extent 1.3,6.675 1.5,8.075
3D body: height 0.2, standoff 0, extent 0.9,6.675 1.1,8.075
3D body: height 0.2, standoff 0, extent 0.5,6.675 0.7,8.075
3D body: height 0.2, standoff 0, extent 0.1,6.675 0.3,8.075
3D body: height 0.2, standoff 0, extent 2.9,6.675 3.1,8.075
3D body: height 0.2, standoff 0, extent 2.5,6.675 2.7,8.075
3D body: height 0.2, standoff 0, extent 2.1,6.675 2.3,8.075
3D body: height 0.2, standoff 0, extent 1.7,6.675 1.9,8.075
3D body: height 0.2, standoff 0, extent 4.5,6.675 4.7,8.075
3D body: height 0.2, standoff 0, extent 4.1,6.675 4.3,8.075
3D body: height 0.2, standoff 0, extent 3.7,6.675 3.9,8.075
3D body: height 0.2, standoff 0, extent 3.3,6.675 3.5,8.075
3D body: height 0.2, standoff 0, extent 4.9,6.675 5.1,8.075
3D body: height 0.2, standoff 0, extent 5.3,6.675 5.5,8.075
3D body: height 0.2, standoff 0, extent 5.7,6.675 5.9,8.075
3D body: height 0.2, standoff 0, extent 6.1,6.675 6.3,8.075

## MSOP-10 0.5mm [mm] "TSSOP, 10-Leads, Body 3.00x3.00mm, Pitch 0.50mm, IPC Medium Density"
height 1.1
pads (10):
  oval 1.65x0.292 smd mask+0: 1(-2.025,1) 2(-2.025,0.5) 3(-2.025,0) 4(-2.025,-0.5) 5(-2.025,-1) 6(2.025,-1) 7(2.025,-0.5) 8(2.025,0) 9(2.025,0.5) 10(2.025,1)
Top Overlay:
  circle w0.203: c-2.032,1.397 r0.102
  lines w0.2: -0.8,-1.5 -0.8,1.5 0.8,1.5 0.8,-1.5 -0.8,-1.5
Top 3D Body:
  circle w0.1: c-0.6,0.6 r0.5
  lines w0.1: -1.5,-1.5 -1.5,1.5 1.5,1.5 1.5,-1.5 -1.5,-1.5
Top Courtyard:
  lines w0.05: -3.1,-1.75 -3.1,1.75 3.1,1.75 3.1,-1.75 -3.1,-1.75
  lines w0.1: -0.5,0 0.5,0 ; 0,-0.5 0,0.5
3D body: height 0.2, standoff 0, extent -2.375,-1.1 2.375,-0.9
3D body: height 0.2, standoff 0, extent -2.375,-0.6 2.375,-0.4
3D body: height 0.2, standoff 0, extent -2.375,-0.1 2.375,0.1
3D body: height 0.2, standoff 0, extent -2.375,0.4 2.375,0.6
3D body: height 0.2, standoff 0, extent -2.375,0.9 2.375,1.1
3D body: height 1.1, standoff 0, extent -1.5,-1.5 1.5,1.5

## NET TIE SURFACE OUTSIDE [mm]
pads (2):
  round 0.7 smd paste-2 mask+0.102: 1(-0.46,0) 2(0.46,0)
Top Layer:
  lines w0.7: -0.46,0 0.46,0

## NET TIE SURFACE OUTSIDE TINY [mil]
pads (2):
  round 10 smd paste-39.37 mask+4: 1(-10,0) 2(10,0)
Top Layer:
  lines w10: -10,0 10,0

## NET TIE TH OUTSIDE [mm]
pads (2):
  round 0.7 hole 0.5 mask+0.102: 1(-0.46,0) 2(0.46,0)
Top Layer:
  lines w0.7: -0.46,0 0.46,0

## NET TIE VIA [mm]
pads (2):
  round 0.7 hole 0.5 mask+0.102: 1(0,0) 2(0,0)